# Altium footprint library Indruino.PcbLib: 383 footprints (part 12 of 24)
Each footprint in its own frame and in the unit in brackets; x right, y up, seen from the top. Pads: shape width x height; smd on the part's side, far side on the other; paste and mask are expansions set on the pad; w line width, h text height; cw(c..) or ccw(c..) is an arc to the next point about the centre after c.
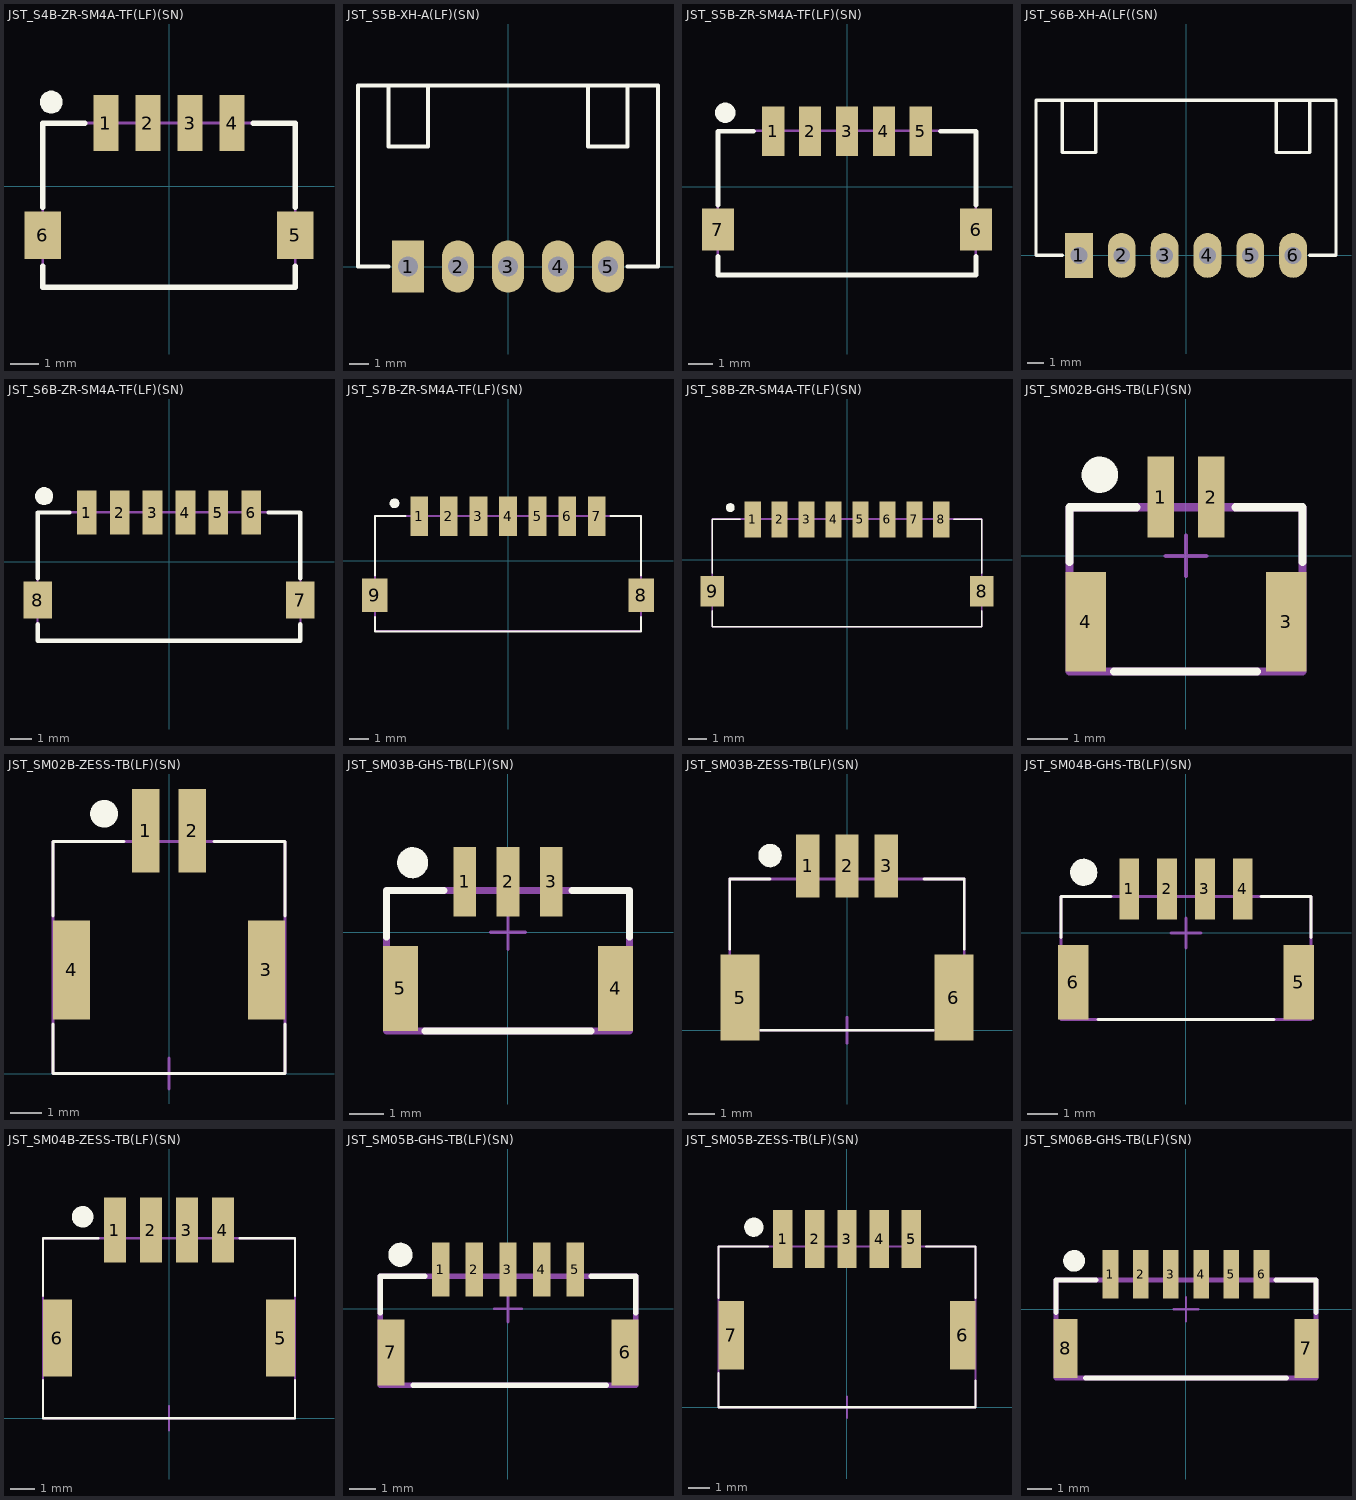
[diagram p11: the footprints below, top view; thin cyan lines are the x and y axes]

## JST_S4B-ZR-SM4A-TF(LF)(SN) [mm]
pads (6):
  rect 0.9x2 smd: 1(-2.25,2.25) 2(-0.75,2.25) 3(0.75,2.25) 4(2.25,2.25)
  rect 1.3x1.7 smd: 5(4.5,-1.75) 6(-4.5,-1.75)
Top Overlay:
  region: -4.2,2.6 -4.28,2.6 -4.427,2.661 -4.539,2.773 -4.6,2.92 -4.6,3 -4.6,3.08 -4.539,3.227 -4.427,3.339 -4.28,3.4 -4.2,3.4 -4.12,3.4 -3.973,3.339 -3.861,3.227 -3.8,3.08 -3.8,3 -3.8,2.92 -3.861,2.773 -3.973,2.661 -4.12,2.6
  lines w0.2: -4.5,-2.85 -4.5,-3.6 4.5,-3.6 4.5,-2.85 ; -4.5,-0.75 -4.5,2.25 -3,2.25 ; 3,2.25 4.5,2.25 4.5,-0.75
Mechanical 13:
  lines w0.1: -4.5,-3.585 -4.5,2.25 4.5,2.25 4.5,-3.585 -4.5,-3.585
3D body "ZHR-4.STEP": height 3.62, standoff 0.22, extent -3.75,-5 3.75,-0.2
3D body "S4B-ZR-SM4A-TF.STEP": height 3.7, standoff 0, extent -4.5,-3.6 4.5,2.9

## JST_S5B-XH-A(LF)(SN) [mm]
pads (5):
  rect 1.65x2.65 hole 1: 1(-5.08,0)
  oval 1.65x2.65 hole 1: 2(-2.54,0) 3(0,0) 4(2.54,0) 5(5.08,0)
Top Overlay:
  lines w0.2: -6.07,0 -7.62,0 -7.62,9.2 7.62,9.2 7.62,0 6.07,0 ; -6.07,9.2 -6.07,6.1 -4.07,6.1 -4.07,9.2 ; 4.07,9.2 4.07,6.1 6.07,6.1 6.07,9.2
3D body "S5B-XH-A.STEP": height 6.15, standoff -3.4, extent -7.45,-2.3 7.45,9.2

## JST_S5B-ZR-SM4A-TF(LF)(SN) [mm]
pads (7):
  rect 0.9x2 smd: 1(-3,2.25) 2(-1.5,2.25) 3(0,2.25) 4(1.5,2.25) 5(3,2.25)
  rect 1.3x1.7 smd: 6(5.25,-1.75) 7(-5.25,-1.75)
Top Overlay:
  region: -4.95,2.6 -5.03,2.6 -5.177,2.661 -5.289,2.773 -5.35,2.92 -5.35,3 -5.35,3.08 -5.289,3.227 -5.177,3.339 -5.03,3.4 -4.95,3.4 -4.87,3.4 -4.723,3.339 -4.611,3.227 -4.55,3.08 -4.55,3 -4.55,2.92 -4.611,2.773 -4.723,2.661 -4.87,2.6
  lines w0.2: -5.25,-2.85 -5.25,-3.6 5.25,-3.6 5.25,-2.85 ; -5.25,-0.75 -5.25,2.25 -3.795,2.25 ; 3.795,2.25 5.25,2.25 5.25,-0.75
Mechanical 13:
  lines w0.1: -5.26,-3.59 -5.26,2.26 5.245,2.26 5.245,-3.59 -5.26,-3.59
3D body "S5B-ZR-SM4A_TF.stp": height 3.7, standoff 0, extent -5.23,-3.6 5.27,2.9
3D body "ZHR-5.STEP": height 3.62, standoff 0.22, extent -4.5,-5 4.5,-0.2

## JST_S6B-XH-A(LF((SN) [mm]
pads (6):
  rect 1.65x2.65 hole 1: 1(-6.35,0)
  oval 1.65x2.65 hole 1: 2(-3.81,0) 3(-1.27,0) 4(1.27,0) 5(3.81,0) 6(6.35,0)
Top Overlay:
  lines w0.2: -7.34,0 -8.89,0 -8.89,9.2 8.89,9.2 8.89,0 7.34,0 ; -7.34,9.2 -7.34,6.1 -5.34,6.1 -5.34,9.2 ; 5.34,9.2 5.34,6.1 7.34,6.1 7.34,9.2
3D body "S6B-XH-A.STEP": height 6.15, standoff -3.4, extent -8.7,-2.3 8.7,9.2

## JST_S6B-ZR-SM4A-TF(LF)(SN) [mm]
pads (8):
  rect 0.9x2 smd: 1(-3.75,2.25) 2(-2.25,2.25) 3(-0.75,2.25) 4(0.75,2.25) 5(2.25,2.25) 6(3.75,2.25)
  rect 1.3x1.7 smd: 7(6,-1.75) 8(-6,-1.75)
Top Overlay:
  region: -5.7,2.6 -5.78,2.6 -5.927,2.661 -6.039,2.773 -6.1,2.92 -6.1,3 -6.1,3.08 -6.039,3.227 -5.927,3.339 -5.78,3.4 -5.7,3.4 -5.62,3.4 -5.473,3.339 -5.361,3.227 -5.3,3.08 -5.3,3 -5.3,2.92 -5.361,2.773 -5.473,2.661 -5.62,2.6
  lines w0.2: -6,-2.85 -6,-3.6 6,-3.6 6,-2.85 ; -6,-0.75 -6,2.25 -4.545,2.25 ; 4.545,2.25 6,2.25 6,-0.75
Mechanical 13:
  lines w0.1: -6,-3.59 -6,2.26 6,2.26 6,-3.59 -6,-3.59
3D body "S6B-ZR-SM4A-TF.STEP": height 3.7, standoff 0, extent -6,-3.6 6,2.9
3D body "ZHR-6.STEP": height 3.62, standoff 0.22, extent -5.25,-5 5.25,-0.2

## JST_S7B-ZR-SM4A-TF(LF)(SN) [mm]
pads (9):
  rect 0.9x2 smd: 1(-4.5,2.25) 2(-3,2.25) 3(-1.5,2.25) 4(0,2.25) 5(1.5,2.25) 6(3,2.25) 7(4.5,2.25)
  rect 1.3x1.7 smd: 8(6.75,-1.75) 9(-6.75,-1.75)
Top Overlay:
  circle w0.1: c-5.75,2.9 r0.2
  region: -5.75,2.7 -5.79,2.7 -5.863,2.73 -5.92,2.787 -5.95,2.86 -5.95,2.9 -5.95,2.94 -5.92,3.013 -5.863,3.07 -5.79,3.1 -5.75,3.1 -5.71,3.1 -5.637,3.07 -5.58,3.013 -5.55,2.94 -5.55,2.9 -5.55,2.86 -5.58,2.787 -5.637,2.73 -5.71,2.7
  lines w0.1: -6.75,-2.85 -6.75,-3.6 6.75,-3.6 6.75,-2.85 ; -6.75,-0.75 -6.75,2.25 -5.2,2.25 ; 5.2,2.25 6.75,2.25 6.75,-0.75
Mechanical 13:
  lines w0.1: -6.75,-3.575 6.75,-3.575 6.75,2.26 -6.75,2.26 -6.75,-3.575
3D body "S7B-ZR-SM4A_TF.stp": height 3.7, standoff 0, extent -6.75,-3.615 6.75,2.885
3D body "ZHR-7.STEP": height 3.62, standoff 0.22, extent -6,-5 6,-0.2

## JST_S8B-ZR-SM4A-TF(LF)(SN) [mm]
pads (10):
  rect 0.9x2 smd: 1(-5.25,2.25) 2(-3.75,2.25) 3(-2.25,2.25) 4(-0.75,2.25) 5(0.75,2.25) 6(2.25,2.25) 7(3.75,2.25) 8(5.25,2.25)
  rect 1.3x1.7 smd: 8(7.5,-1.75) 9(-7.5,-1.75)
Top Overlay:
  circle w0.1: c-6.5,2.9 r0.2
  region: -6.5,2.7 -6.54,2.7 -6.613,2.73 -6.67,2.787 -6.7,2.86 -6.7,2.9 -6.7,2.94 -6.67,3.013 -6.613,3.07 -6.54,3.1 -6.5,3.1 -6.46,3.1 -6.387,3.07 -6.33,3.013 -6.3,2.94 -6.3,2.9 -6.3,2.86 -6.33,2.787 -6.387,2.73 -6.46,2.7
  lines w0.1: -7.5,-2.85 -7.5,-3.728 7.5,-3.728 7.5,-2.85 ; -7.5,-0.75 -7.5,2.25 -5.95,2.25 ; 5.95,2.25 7.5,2.25 7.5,-0.75
Mechanical 13:
  lines w0.1: -7.501,-3.727 7.499,-3.727 7.5,2.26 -7.5,2.26 -7.501,-3.727
3D body "S8B-ZR-SM4A-TF.STEP": height 3.75, standoff 0.05, extent -7.5,-3.725 7.5,2.775

## JST_SM02B-GHS-TB(LF)(SN) [mm]
pads (4):
  rect 0.65x2 smd: 1(-0.625,1.45) 2(0.625,1.45)
  rect 1x2.45 smd: 3(2.475,-1.625) 4(-2.475,-1.625)
Top Overlay:
  circle w0.2: c-2.125,2 r0.35
  region: -2.125,1.65 -2.195,1.65 -2.323,1.703 -2.422,1.802 -2.475,1.93 -2.475,2 -2.475,2.07 -2.422,2.198 -2.323,2.297 -2.195,2.35 -2.125,2.35 -2.055,2.35 -1.927,2.297 -1.828,2.198 -1.775,2.07 -1.775,2 -1.775,1.93 -1.828,1.802 -1.927,1.703 -2.055,1.65
  lines w0.2: -2.875,-0.15 -2.875,1.2 -1.225,1.2 ; -1.775,-2.85 1.75,-2.85 ; 1.225,1.2 2.875,1.2 2.875,-0.15
Mechanical 13:
  lines w0.2: -2.875,-2.85 2.875,-2.85 2.875,1.2 -2.875,1.2 -2.875,-2.85
Mechanical 15:
  lines w0.1: -0.5,0 0.5,0 ; 0,-0.5 0,0.5
3D body "GHR-02V-S.STEP": height 4.43, standoff 0.28, extent -1.87,-5.96 1.88,-0.26
3D body "SM02B-GHS-TB.STEP": height 4.35, standoff 0, extent -2.875,-2.85 2.875,2

## JST_SM02B-ZESS-TB(LF)(SN) [mm]
pads (4):
  rect 0.9x2.7 smd: 1(-0.75,7.85) 2(0.75,7.85)
  rect 1.2x3.2 smd: 3(3.15,3.35) 4(-3.15,3.35)
Top Overlay:
  circle w0.2: c-2.1,8.4 r0.35
  region: -2.1,8.05 -2.17,8.05 -2.298,8.103 -2.397,8.202 -2.45,8.33 -2.45,8.4 -2.45,8.47 -2.397,8.598 -2.298,8.697 -2.17,8.75 -2.1,8.75 -2.03,8.75 -1.902,8.697 -1.803,8.598 -1.75,8.47 -1.75,8.4 -1.75,8.33 -1.803,8.202 -1.902,8.103 -2.03,8.05
  lines w0.1: -3.75,1.6 -3.75,0 3.75,0 3.75,1.6 ; -3.75,5.1 -3.75,7.5 -1.45,7.5 ; 1.45,7.5 3.75,7.5 3.75,5.1
Mechanical 13:
  lines w0.1: -3.75,0 -3.75,7.5 3.75,7.5 3.75,0 -3.75,0
Mechanical 15:
  lines w0.1: -0.5,0 0.5,0 ; 0,-0.5 0,0.5
3D body "SM02B-ZESS-TB.STEP": height 5.9, standoff 0, extent -3.75,0 3.75,8.7
3D body "ZER-02V-S.STEP": height 6.2, standoff 0.5, extent -2.5,-1.9 2.5,5.6

## JST_SM03B-GHS-TB(LF)(SN) [mm]
pads (5):
  rect 0.65x2 smd: 1(-1.25,1.45) 2(0,1.45) 3(1.25,1.45)
  rect 1x2.45 smd: 4(3.1,-1.625) 5(-3.1,-1.625)
Top Overlay:
  circle w0.2: c-2.75,2 r0.35
  region: -2.75,1.65 -2.82,1.65 -2.948,1.703 -3.047,1.802 -3.1,1.93 -3.1,2 -3.1,2.07 -3.047,2.198 -2.948,2.297 -2.82,2.35 -2.75,2.35 -2.68,2.35 -2.552,2.297 -2.453,2.198 -2.4,2.07 -2.4,2 -2.4,1.93 -2.453,1.802 -2.552,1.703 -2.68,1.65
  lines w0.2: -3.5,-0.15 -3.5,1.2 -1.85,1.2 ; -2.4,-2.85 2.4,-2.85 ; 1.85,1.2 3.5,1.2 3.5,-0.15
Mechanical 13:
  lines w0.2: -3.5,-2.85 3.5,-2.85 3.5,1.2 -3.5,1.2 -3.5,-2.85
Mechanical 15:
  lines w0.1: -0.5,0 0.5,0 ; 0,-0.5 0,0.5
3D body "SM03B-GHS-TB.STEP": height 4.35, standoff 0, extent -3.5,-2.85 3.5,2
3D body "GHR-03V-S.STEP": height 4.43, standoff 0.28, extent -2.497,-5.96 2.503,-0.26

## JST_SM03B-ZESS-TB(LF)(SN) [mm]
pads (5):
  rect 0.9x2.4 smd: 1(-1.5,6.3) 2(0,6.3) 3(1.5,6.3)
  rect 1.5x3.3 smd: 5(-4.1,1.25) 6(4.1,1.25)
Top Overlay:
  circle w0.2: c-2.95,6.7 r0.35
  region: -2.95,6.35 -3.02,6.35 -3.148,6.403 -3.247,6.502 -3.3,6.63 -3.3,6.7 -3.3,6.77 -3.247,6.898 -3.148,6.997 -3.02,7.05 -2.95,7.05 -2.88,7.05 -2.752,6.997 -2.653,6.898 -2.6,6.77 -2.6,6.7 -2.6,6.63 -2.653,6.502 -2.752,6.403 -2.88,6.35
  lines w0.1: -4.5,3.1 -4.5,5.8 -2.95,5.8 ; -3.3,0 3.3,0 ; 2.95,5.8 4.5,5.8 4.5,3.1
Mechanical 13:
  lines w0.1: -4.5,0 4.5,0 4.5,5.8 -4.5,5.8 -4.5,0
Mechanical 15:
  lines w0.1: -0.5,0 0.5,0 ; 0,-0.5 0,0.5
3D body "ZER-03V-S.STEP": height 6.25, standoff 0.55, extent -3.15,-3.6 3.15,3.9
3D body "SM03B-ZESS-TB.STEP": height 5.9, standoff 0, extent -4.5,-1.75 4.5,6.95

## JST_SM04B-GHS-TB(LF)(SN) [mm]
pads (6):
  rect 0.65x2 smd: 1(-1.875,1.45) 2(-0.625,1.45) 3(0.625,1.45) 4(1.875,1.45)
  rect 1x2.45 smd: 5(3.725,-1.625) 6(-3.725,-1.625)
Top Overlay:
  circle w0.2: c-3.375,2 r0.35
  region: -3.375,1.65 -3.445,1.65 -3.573,1.703 -3.672,1.802 -3.725,1.93 -3.725,2 -3.725,2.07 -3.672,2.198 -3.573,2.297 -3.445,2.35 -3.375,2.35 -3.305,2.35 -3.177,2.297 -3.078,2.198 -3.025,2.07 -3.025,2 -3.025,1.93 -3.078,1.802 -3.177,1.703 -3.305,1.65
  lines w0.1: -4.125,-0.15 -4.125,1.2 -2.475,1.2 ; -2.9,-2.85 2.9,-2.85 ; 2.475,1.2 4.125,1.2 4.125,-0.15
Mechanical 13:
  lines w0.1: -4.125,-2.85 4.125,-2.85 4.125,1.2 -4.125,1.2 -4.125,-2.85
Mechanical 15:
  lines w0.1: -0.5,0 0.5,0 ; 0,-0.5 0,0.5
3D body "SM04B-GHS-TB.STEP": height 4.35, standoff 0, extent -4.125,-2.85 4.125,2
3D body "GHR-04V-S.STEP": height 4.43, standoff 0.28, extent -3.125,-5.97 3.125,-0.27

## JST_SM04B-ZESS-TB(LF)(SN) [mm]
pads (6):
  rect 0.9x2.7 smd: 1(-2.25,7.85) 2(-0.75,7.85) 3(0.75,7.85) 4(2.25,7.85)
  rect 1.2x3.2 smd: 5(4.65,3.35) 6(-4.65,3.35)
Top Overlay:
  circle w0.2: c-3.6,8.4 r0.35
  region: -3.6,8.05 -3.67,8.05 -3.798,8.103 -3.897,8.202 -3.95,8.33 -3.95,8.4 -3.95,8.47 -3.897,8.598 -3.798,8.697 -3.67,8.75 -3.6,8.75 -3.53,8.75 -3.402,8.697 -3.303,8.598 -3.25,8.47 -3.25,8.4 -3.25,8.33 -3.303,8.202 -3.402,8.103 -3.53,8.05
  lines w0.1: -5.25,1.6 -5.25,0 5.25,0 5.25,1.6 ; -5.25,5.1 -5.25,7.5 -2.95,7.5 ; 2.95,7.5 5.25,7.5 5.25,5.1
Mechanical 13:
  lines w0.1: -5.25,0 5.25,0 5.25,7.5 -5.25,7.5 -5.25,0
Mechanical 15:
  lines w0.1: -0.5,0 0.5,0 ; 0,-0.5 0,0.5
3D body "ZER-04V-S.STEP": height 5.9, standoff 0.2, extent -3.9,-1.9 3.9,5.6
3D body "SM04B-ZESS-TB.STEP": height 5.9, standoff 0, extent -5.25,0 5.25,8.7

## JST_SM05B-GHS-TB(LF)(SN) [mm]
pads (7):
  rect 0.65x2 smd: 1(-2.5,1.45) 2(-1.25,1.45) 3(0,1.45) 4(1.25,1.45) 5(2.5,1.45)
  rect 1x2.45 smd: 6(4.35,-1.625) 7(-4.35,-1.625)
Top Overlay:
  circle w0.2: c-4,2 r0.35
  region: -4,1.65 -4.07,1.65 -4.198,1.703 -4.297,1.802 -4.35,1.93 -4.35,2 -4.35,2.07 -4.297,2.198 -4.198,2.297 -4.07,2.35 -4,2.35 -3.93,2.35 -3.802,2.297 -3.703,2.198 -3.65,2.07 -3.65,2 -3.65,1.93 -3.703,1.802 -3.802,1.703 -3.93,1.65
  lines w0.2: -4.75,-0.15 -4.75,1.2 -3.1,1.2 ; -3.525,-2.85 3.65,-2.85 ; 3.1,1.2 4.75,1.2 4.75,-0.15
Mechanical 13:
  lines w0.2: -4.75,-2.85 4.75,-2.85 4.75,1.2 -4.75,1.2 -4.75,-2.85
Mechanical 15:
  lines w0.1: -0.5,0 0.5,0 ; 0,-0.5 0,0.5
3D body "SM05B-GHS-TB.STEP": height 4.35, standoff 0, extent -4.75,-2.875 4.75,1.975
3D body "GHR-05V-S.STEP": height 4.43, standoff 0.28, extent -3.75,-5.99 3.75,-0.29

## JST_SM05B-ZESS-TB(LF)(SN) [mm]
pads (7):
  rect 0.9x2.7 smd: 1(-3,7.85) 2(-1.5,7.85) 3(0,7.85) 4(1.5,7.85) 5(3,7.85)
  rect 1.2x3.2 smd: 6(5.4,3.35) 7(-5.4,3.35)
Top Overlay:
  circle w0.2: c-4.35,8.4 r0.35
  region: -4.35,8.05 -4.42,8.05 -4.548,8.103 -4.647,8.202 -4.7,8.33 -4.7,8.4 -4.7,8.47 -4.647,8.598 -4.548,8.697 -4.42,8.75 -4.35,8.75 -4.28,8.75 -4.152,8.697 -4.053,8.598 -4,8.47 -4,8.4 -4,8.33 -4.053,8.202 -4.152,8.103 -4.28,8.05
  lines w0.1: -6,1.6 -6,0 6,0 6,1.25 ; -6,5.1 -6,7.5 -3.7,7.5 ; 3.7,7.5 6,7.5 6,5.1
Mechanical 13:
  lines w0.1: -6,0 -6,7.5 6,7.5 6,0 -6,0
Mechanical 15:
  lines w0.1: -0.5,0 0.5,0 ; 0,-0.5 0,0.5
3D body "ZER-05V-S.STEP": height 5.9, standoff 0.2, extent -4.65,-1.9 4.65,5.6
3D body "SM05B-ZESS-TB.STEP": height 5.9, standoff 0, extent -6,0 6,8.7

## JST_SM06B-GHS-TB(LF)(SN) [mm]
pads (8):
  rect 0.65x2 smd: 1(-3.125,1.45) 2(-1.875,1.45) 3(-0.625,1.45) 4(0.625,1.45) 5(1.875,1.45) 6(3.125,1.45)
  rect 1x2.45 smd: 7(4.975,-1.625) 8(-4.975,-1.625)
Top Overlay:
  circle w0.2: c-4.625,2 r0.35
  region: -4.625,1.65 -4.695,1.65 -4.823,1.703 -4.922,1.802 -4.975,1.93 -4.975,2 -4.975,2.07 -4.922,2.198 -4.823,2.297 -4.695,2.35 -4.625,2.35 -4.555,2.35 -4.427,2.297 -4.328,2.198 -4.275,2.07 -4.275,2 -4.275,1.93 -4.328,1.802 -4.427,1.703 -4.555,1.65
  lines w0.2: -5.375,-0.15 -5.375,1.2 -3.725,1.2 ; -4.15,-2.85 4.15,-2.85 ; 3.725,1.2 5.375,1.2 5.375,-0.15
Mechanical 13:
  lines w0.2: -5.375,-2.85 5.375,-2.85 5.375,1.2 -5.375,1.2 -5.375,-2.85
Mechanical 15:
  lines w0.1: -0.5,0 0.5,0 ; 0,-0.5 0,0.5
3D body "GHR-06V-S.STEP": height 4.5, standoff 0.35, extent -4.335,-5.96 4.415,-0.26
3D body "SM06B-GHS-TB.STEP": height 4.35, standoff 0, extent -5.375,-2.85 5.375,2